# Altium footprint library EPCOS.PcbLib: 178 footprints (part 7 of 12)
Each footprint in its own frame and in the unit in brackets; x right, y up, seen from the top. Pads: shape width x height; smd on the part's side, far side on the other; paste and mask are expansions set on the pad; w line width, h text height; cw(c..) or ccw(c..) is an arc to the next point about the centre after c.
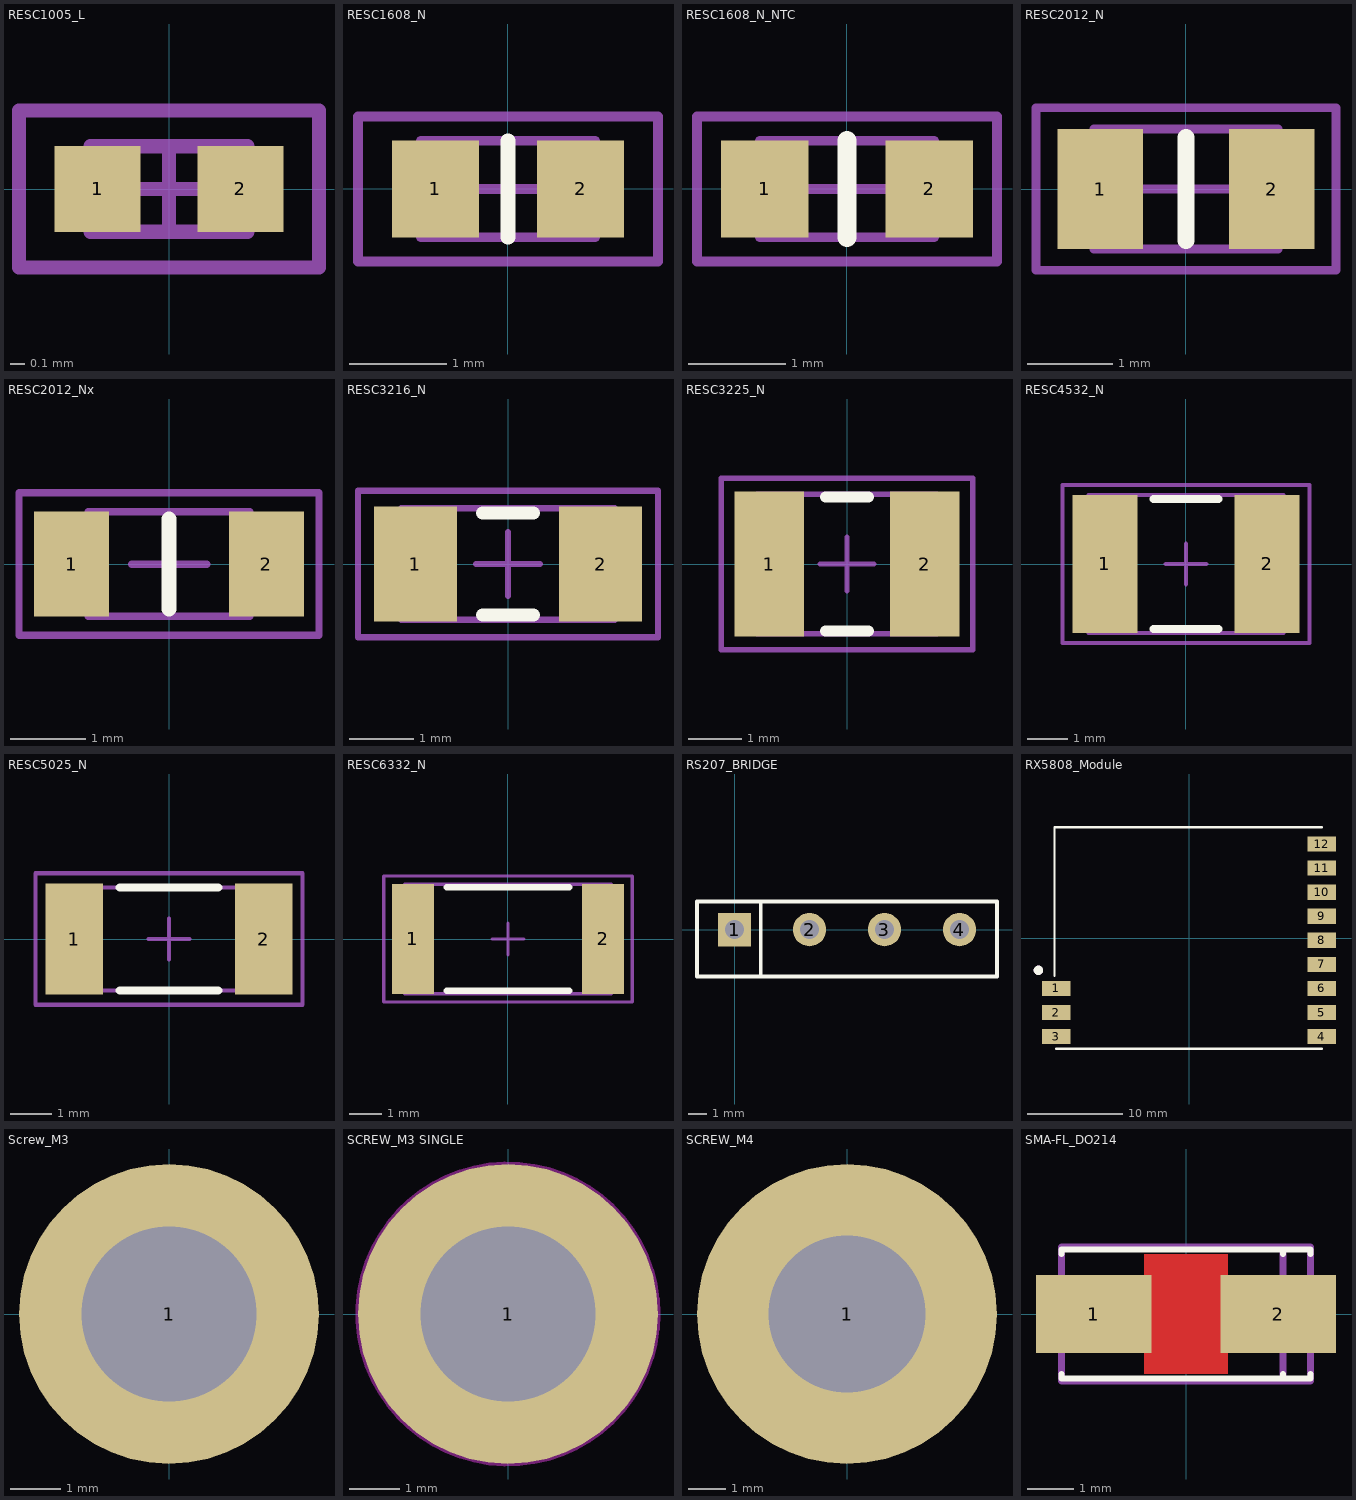
[diagram p6: the footprints below, top view; thin cyan lines are the x and y axes]

## RESC1005_L [mm] "Chip Resistor, Body 1.1x0.5mm, IPC High Density"
height 0.4
pads (2):
  rect 0.6x0.6 smd: 1(-0.5,0) 2(0.5,0)
Mechanical 13:
  lines w0.1: -0.55,-0.3 0.55,-0.3 0.55,0.3 -0.55,0.3 -0.55,-0.3
Mechanical 15:
  lines w0.1: -0.3,0 0.3,0 ; 0,-0.3 0,0.3 ; -1.05,-0.55 1.05,-0.55 1.05,0.55 -1.05,0.55 -1.05,-0.55
3D body "User Library-RESC1005X04N.step": height 0.35, standoff 0, extent -0.5,-0.25 0.5,0.25

## RESC1608_N [mm]
height 0.6
pads (2):
  rect 0.9x1 smd: 1(-0.75,0) 2(0.75,0)
Top Overlay:
  lines w0.15: 0,-0.5 0,0.5
Mechanical 13:
  lines w0.1: -0.6,-0.5 -0.6,0.5 ; 0.6,-0.5 0.6,0.5 ; -0.9,-0.5 0.9,-0.5 0.9,0.5 -0.9,0.5 -0.9,-0.5
Mechanical 15:
  lines w0.1: -0.475,0 0.475,0 ; 0,-0.475 0,0.475 ; -1.55,-0.75 -1.55,0.75 1.55,0.75 1.55,-0.75 -1.55,-0.75
3D body "User Library-R-0603.step": height 0.56, standoff 0, extent -0.85,-0.4 0.85,0.4

## RESC1608_N_NTC [mm]
height 0.6
pads (2):
  rect 0.9x1 smd: 1(-0.85,0) 2(0.85,0)
Top Overlay:
  lines w0.2: 0,-0.5 0,0.5
Mechanical 13:
  lines w0.1: -0.6,-0.5 -0.6,0.5 ; 0.6,-0.5 0.6,0.5 ; -0.9,-0.5 0.9,-0.5 0.9,0.5 -0.9,0.5 -0.9,-0.5
Mechanical 15:
  lines w0.1: -0.475,0 0.475,0 ; 0,-0.475 0,0.475 ; -1.55,-0.75 -1.55,0.75 1.55,0.75 1.55,-0.75 -1.55,-0.75
3D body "User Library-Chip Resistor2.step": height 0.38, standoff 0, extent -0.8,-0.4 0.8,0.4

## RESC2012_N [mm]
height 0.65
pads (2):
  rect 1x1.4 smd: 1(-1,0) 2(1,0)
Top Overlay:
  lines w0.2: 0,-0.6 0,0.6
Mechanical 13:
  lines w0.1: -0.85,-0.7 -0.85,0.7 ; 0.85,-0.7 0.85,0.7 ; -1.075,-0.7 -1.075,0.7 1.075,0.7 1.075,-0.7 -1.075,-0.7
Mechanical 15:
  lines w0.1: -0.5,0 0.5,0 ; 0,-0.5 0,0.5 ; -1.75,-0.95 -1.75,0.95 1.75,0.95 1.75,-0.95 -1.75,-0.95
3D body "User Library-R0805-3.step": height 0.55, standoff 0, extent -1,-0.63 1,0.63

## RESC2012_Nx [mm]
height 0.65
pads (2):
  rect 1x1.4 smd: 1(-1.3,0) 2(1.3,0)
Top Overlay:
  lines w0.2: 0,-0.6 0,0.6
Mechanical 13:
  lines w0.1: -1.075,-0.7 1.075,-0.7 1.075,0.7 -1.075,0.7 -1.075,-0.7
Mechanical 15:
  lines w0.1: -0.5,0 0.5,0 ; 0,-0.5 0,0.5 ; -2,-0.95 2,-0.95 2,0.95 -2,0.95 -2,-0.95
3D body: height 0.65, standoff 0, extent -1.075,-0.7 1.075,0.7

## RESC3216_N [mm]
height 0.71
pads (2):
  rect 1.3x1.8 smd: 1(-1.45,0) 2(1.45,0)
Top Overlay:
  lines w0.2: -0.4,-0.8 0.4,-0.8 ; -0.4,0.8 0.4,0.8
Mechanical 13:
  lines w0.1: -1.25,-0.875 -1.25,0.875 ; 1.25,-0.875 1.25,0.875 ; -1.675,-0.875 -1.675,0.875 1.675,0.875 1.675,-0.875 -1.675,-0.875
Mechanical 15:
  lines w0.1: -0.5,0 0.5,0 ; 0,-0.5 0,0.5 ; -2.35,-1.15 -2.35,1.15 2.35,1.15 2.35,-1.15 -2.35,-1.15
3D body "User Library-1206.step": height 0.53, standoff -0.03, extent -1.6,-0.8 1.6,0.8

## RESC3225_N [mm]
height 0.71
pads (2):
  rect 1.3x2.7 smd: 1(-1.45,0) 2(1.45,0)
Top Overlay:
  lines w0.2: -0.4,-1.25 0.4,-1.25 ; -0.4,1.25 0.4,1.25
Mechanical 13:
  lines w0.1: -1.25,-1.3 -1.25,1.3 ; 1.25,-1.3 1.25,1.3 ; -1.675,-1.3 -1.675,1.3 1.675,1.3 1.675,-1.3 -1.675,-1.3
Mechanical 15:
  lines w0.1: -0.5,0 0.5,0 ; 0,-0.5 0,0.5 ; -2.35,-1.6 -2.35,1.6 2.35,1.6 2.35,-1.6 -2.35,-1.6
3D body "User Library-RESC3225X06N.step": height 0.55, standoff 0, extent -1.6,-1.25 1.6,1.25

## RESC4532_N [mm]
height 0.71
pads (2):
  rect 1.6x3.4 smd: 1(-2,0) 2(2,0)
Top Overlay:
  lines w0.2: -0.8,-1.6 0.8,-1.6 ; -0.8,1.6 0.8,1.6
Mechanical 13:
  lines w0.1: -1.8,-1.7 -1.8,1.7 ; 1.8,-1.7 1.8,1.7 ; -2.4,-1.7 -2.4,1.7 2.4,1.7 2.4,-1.7 -2.4,-1.7
Mechanical 15:
  lines w0.1: -0.5,0 0.5,0 ; 0,-0.5 0,0.5 ; -3.05,-1.95 -3.05,1.95 3.05,1.95 3.05,-1.95 -3.05,-1.95
3D body: height 0.71, standoff 0, extent -1.8,-1.7 1.8,1.7
3D body: height 0.71, standoff 0, extent -2.4,-1.7 -1.799,1.7
3D body: height 0.71, standoff 0, extent 1.8,-1.7 2.4,1.7

## RESC5025_N [mm]
height 0.71
pads (2):
  rect 1.4x2.7 smd: 1(-2.3,0) 2(2.3,0)
Top Overlay:
  lines w0.2: -1.2,-1.25 1.2,-1.25 ; -1.2,1.25 1.2,1.25
Mechanical 13:
  lines w0.1: -1.75,-1.25 -1.75,1.25 ; 1.75,-1.25 1.75,1.25 ; -2.5,-1.25 -2.5,1.25 2.5,1.25 2.5,-1.25 -2.5,-1.25
Mechanical 15:
  lines w0.1: -0.5,0 0.5,0 ; 0,-0.5 0,0.5 ; -3.25,-1.6 -3.25,1.6 3.25,1.6 3.25,-1.6 -3.25,-1.6
3D body "User Library-R2010-5025-2.step": height 0.6, standoff 0, extent -2.5,-1.25 2.5,1.25

## RESC6332_N [mm]
height 0.75
pads (2):
  rect 1.3x3.4 smd: 1(-2.95,0) 2(2.95,0)
Top Overlay:
  lines w0.2: -1.9,-1.6 1.9,-1.6 ; -1.9,1.6 1.9,1.6
Mechanical 13:
  lines w0.1: -2.4,-1.7 2.4,-1.7 ; -2.4,-1.7 -2.4,1.7 ; -2.4,-1.7 -3.2,-1.7 -3.2,1.7 -2.4,1.7 ; -2.4,1.7 2.4,1.7 ; 2.4,-1.7 2.4,1.7 ; 2.4,-1.7 3.2,-1.7 3.2,1.7 2.4,1.7 ; 2.4,-1.7 2.4,1.7
Mechanical 15:
  lines w0.1: -0.5,0 0.5,0 ; 0,-0.5 0,0.5 ; -3.85,-1.95 3.85,-1.95 3.85,1.95 -3.85,1.95 -3.85,-1.95
3D body "User Library-R2512-6332.step": height 0.53, standoff -0.03, extent -3.2,-1.6 3.2,1.6

## RS207_BRIDGE [mil]
height 787.4
pads (4):
  rect 70x70 hole 39.37: 1(0,0)
  round 70 hole 39.37: 2(157.48,0) 3(314.96,0) 4(472.44,0)
Top Overlay:
  lines w7.87: 55.12,-98.43 55.12,59.06 ; -78.74,-98.43 -78.74,59.06 551.18,59.06 551.18,-98.43 -78.74,-98.43
3D body "User Library-KBP210.step": height 511.81, standoff -78.74, extent -78.74,-98.42 551.18,59.06

## RX5808_Module [mm] "ESP32-WROOM-32E Wi-Fi Module with integrated Antenna"
height 5
pads (12):
  rect 3x1.6 smd: 1(-14,-5.32) 2(-14,-7.86) 3(-14,-10.4) 4(14,-10.4) 5(14,-7.86) 6(14,-5.32) 7(14,-2.78) 8(14,-0.24) 9(14,2.3) 10(14,4.84) 11(14,7.38) 12(14,9.92)
Top Overlay:
  circle w0.5: c-15.9,-3.4 r0.25
  lines w0.254: -14.2,-4 -14.2,11.7 14,11.7 ; -14,-11.7 14,-11.7
Mechanical 15:
  circle w0.5: c-15.9,-3.4 r0.25
3D body "User Library-RX_5808.step": height 3.11, standoff -0.02, extent -14.3,-11.75 14.4,11.35

## Screw_M3 [mm]
height 2.032
pads (1):
  round 6 hole 3.5 unplated: 1(0,0)
3D body "User Library-M3x0_5x6 Phillips Panhead Screw.step": height 2.38, standoff -6, extent -2.8,-2.8 2.8,2.8

## SCREW_M3 SINGLE [mm]
pads (1):
  round 6 / inner round 6 / far side round 0 hole 3.5 unplated: 1(0,0)
Keep-Out Layer:
  circle w0.1: c0,0 r3

## SCREW_M4 [mm]
height 3
pads (1):
  round 8 hole 4.2: 1(0,0)
3D body "TR Fastenings Ltd-M4X5MM.step": height 4, standoff -5, extent -3.5,-3.5 3.5,3.5

## SMA-FL_DO214 [mm] "Flat DO-214/SMA-FL; Body 5.6 x 2.9 mm"
height 1.1
pads (2):
  rect 2.5x1.7 smd: 1(-2,0) 2(2,0)
Top Layer:
  pour cut-out: -0.9,1.3 0.9,1.3 0.9,-1.3 -0.9,-1.3
Top Overlay:
  lines w0.127: -2.7,-1.3 -2.7,-1.4 2.7,-1.4 2.7,-1.3 ; -2.7,1.3 -2.7,1.4 2.7,1.4 2.7,1.3 ; 2.1,-1.4 2.1,-1.3 ; 2.1,1.3 2.1,1.4
Mechanical 15:
  lines w0.1: -0.5,0 0.5,0 ; 0,-0.5 0,0.5
  lines w0.15: 2.1,-1.45 2.1,1.45 ; -2.7,-1.45 2.7,-1.45 2.7,1.45 -2.7,1.45 -2.7,-1.45
3D body "User Library-SMA-FL_DO-221AC.step": height 1.2, standoff 0, extent -2.8,-1.475 2.8,1.475